# Altium footprint library Connectors.PcbLib: 245 footprints (part 9 of 16)
Each footprint in its own frame and in the unit in brackets; x right, y up, seen from the top. Pads: shape width x height; smd on the part's side, far side on the other; paste and mask are expansions set on the pad; w line width, h text height; cw(c..) or ccw(c..) is an arc to the next point about the centre after c.
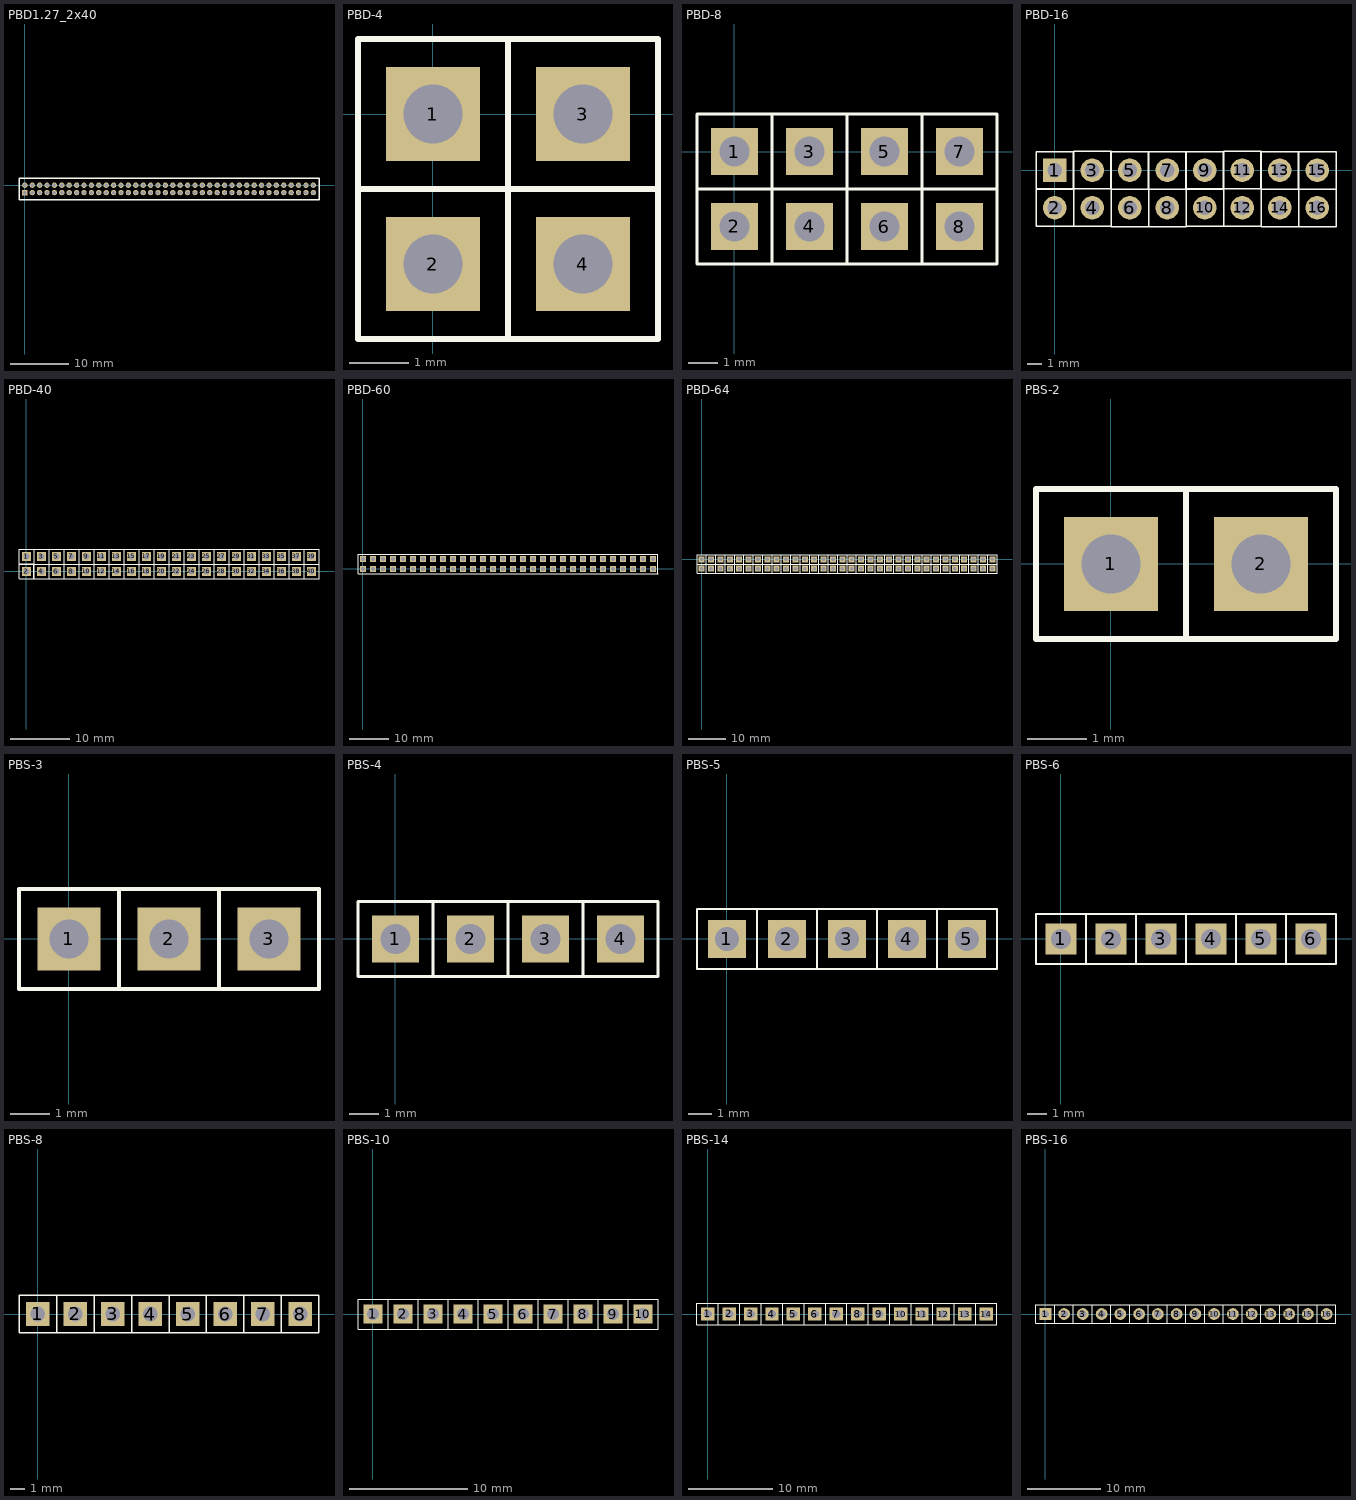
[diagram p8: the footprints below, top view; thin cyan lines are the x and y axes]

## PBD1.27_2х40 [mm]
pads (80):
  rect 0.91x0.91 hole 0.6: 1(0,-1.27)
  round 0.91 hole 0.6: 2(0,0) 3(1.27,-1.27) 4(1.27,0) 5(2.54,-1.27) 6(2.54,0) 7(3.81,-1.27) 8(3.81,0) 9(5.08,-1.27) 10(5.08,0) 11(6.35,-1.27) 12(6.35,0) 13(7.62,-1.27) 14(7.62,0) 15(8.89,-1.27) 16(8.89,0) 17(10.16,-1.27) 18(10.16,0) 19(11.43,-1.27) 20(11.43,0) 21(12.7,-1.27) 22(12.7,0) 23(13.97,-1.27) 24(13.97,0) 25(15.24,-1.27) 26(15.24,0) 27(16.51,-1.27) 28(16.51,0) 29(17.78,-1.27) 30(17.78,0) 31(19.05,-1.27) 32(19.05,0) 33(20.32,-1.27) 34(20.32,0) 35(21.59,-1.27) 36(21.59,0) 37(22.86,-1.27) 38(22.86,0) 39(24.13,-1.27) 40(24.13,0) 41(25.4,-1.27) 42(25.4,0) 43(26.67,-1.27) 44(26.67,0) 45(27.94,-1.27) 46(27.94,0) 47(29.21,-1.27) 48(29.21,0) 49(30.48,-1.27) 50(30.48,0) 51(31.75,-1.27) 52(31.75,0) 53(33.02,-1.27) 54(33.02,0) 55(34.29,-1.27) 56(34.29,0) 57(35.56,-1.27) 58(35.56,0) 59(36.83,-1.27) 60(36.83,0) 61(38.1,-1.27) 62(38.1,0) 63(39.37,-1.27) 64(39.37,0) 65(40.64,-1.27) 66(40.64,0) 67(41.91,-1.27) 68(41.91,0) 69(43.18,-1.27) 70(43.18,0) 71(44.45,-1.27) 72(44.45,0) 73(45.72,-1.27) 74(45.72,0) 75(46.99,-1.27) 76(46.99,0) 77(48.26,-1.27) 78(48.26,0) 79(49.53,-1.27) 80(49.53,0)
Top Overlay:
  lines w0.254: -1,-2.5 -1,1.2 50.5,1.2 50.5,-2.5 -1,-2.5

## PBD-4 [mm]
pads (4):
  rect 1.6x1.6 hole 1: 1(0.001,0) 2(0.001,-2.54) 3(2.541,0) 4(2.541,-2.54)
Top Overlay:
  lines w0.1: -1.269,-1.27 -1.269,1.27 1.271,1.27 ; -1.269,-1.27 1.271,-1.27 ; -1.269,-1.27 1.271,-1.27 ; -1.269,-1.27 -1.269,-3.81 1.271,-3.81 ; 1.271,-3.81 3.811,-3.81 ; 1.271,-3.81 1.271,-1.27 ; 1.271,-3.81 1.271,-1.27 ; 1.271,-1.27 1.271,1.27 ; 1.271,-1.27 3.811,-1.27 ; 1.271,-1.27 1.271,1.27 ; 1.271,-1.27 3.811,-1.27 ; 1.271,1.27 3.811,1.27 ; 3.811,-3.81 3.811,-1.27 ; 3.811,-3.81 3.811,-1.27 ; 3.811,-1.27 3.811,1.27 ; 3.811,-1.27 3.811,1.27
3D body "User Library-PBS-01.step": height 8.4, standoff -3.2, extent 1.271,-3.81 3.811,-1.27
3D body "User Library-PBS-01.step": height 8.4, standoff -3.2, extent -1.269,-3.81 1.271,-1.27
3D body "User Library-PBS-01.step": height 8.4, standoff -3.2, extent 1.271,-1.27 3.811,1.27
3D body "User Library-PBS-01.step": height 8.4, standoff -3.2, extent -1.269,-1.27 1.271,1.27

## PBD-8 [mm]
pads (8):
  rect 1.6x1.6 hole 1: 1(0,0) 2(0,-2.54) 3(2.54,0) 4(2.54,-2.54) 5(5.08,0) 6(5.08,-2.54) 7(7.62,0) 8(7.62,-2.54)
Top Overlay:
  lines w0.1: -1.27,-1.27 -1.27,1.27 1.27,1.27 ; -1.27,-1.27 1.27,-1.27 ; -1.27,-1.27 1.27,-1.27 ; -1.27,-1.27 -1.27,-3.81 1.27,-3.81 ; 1.27,-3.81 3.81,-3.81 ; 1.27,-3.81 1.27,-1.27 ; 1.27,-3.81 1.27,-1.27 ; 1.27,-1.27 1.27,1.27 ; 1.27,-1.27 3.81,-1.27 ; 1.27,-1.27 1.27,1.27 ; 1.27,-1.27 3.81,-1.27 ; 1.27,1.27 3.81,1.27 ; 3.81,-3.81 3.81,-1.27 ; 3.81,-3.81 6.35,-3.81 ; 3.81,-3.81 3.81,-1.27 ; 3.81,-3.81 3.81,-1.27 ; 3.81,-1.27 6.35,-1.27 ; 3.81,-1.27 6.35,-1.27 ; 3.81,-1.27 3.81,1.27 ; 3.81,-1.27 3.81,1.27 ; 3.81,-1.27 3.81,1.27 ; 3.81,1.27 6.35,1.27 ; 6.35,-3.81 6.35,-1.27 ; 6.35,-3.81 6.35,-1.27 ; 6.35,-3.81 8.89,-3.81 ; 6.35,-1.27 8.89,-1.27 ; 6.35,-1.27 6.35,1.27 ; 6.35,-1.27 8.89,-1.27 ; 6.35,-1.27 6.35,1.27 ; 6.35,1.27 8.89,1.27 ; 8.89,-3.81 8.89,-1.27 ; 8.89,-3.81 8.89,-1.27 ; 8.89,-1.27 8.89,1.27 ; 8.89,-1.27 8.89,1.27
3D body "User Library-PBS-01.step": height 8.4, standoff -3.2, extent 3.81,-1.27 6.35,1.27
3D body "User Library-PBS-01.step": height 8.4, standoff -3.2, extent 6.35,-1.27 8.89,1.27
3D body "User Library-PBS-01.step": height 8.4, standoff -3.2, extent 3.81,-3.81 6.35,-1.27
3D body "User Library-PBS-01.step": height 8.4, standoff -3.2, extent 6.35,-3.81 8.89,-1.27
3D body "User Library-PBS-01.step": height 8.4, standoff -3.2, extent 1.27,-3.81 3.81,-1.27
3D body "User Library-PBS-01.step": height 8.4, standoff -3.2, extent -1.27,-3.81 1.27,-1.27
3D body "User Library-PBS-01.step": height 8.4, standoff -3.2, extent 1.27,-1.27 3.81,1.27
3D body "User Library-PBS-01.step": height 8.4, standoff -3.2, extent -1.27,-1.27 1.27,1.27

## PBD-16 [mm]
pads (16):
  rect 1.6x1.6 hole 1: 1(0,0)
  round 1.6 hole 1: 2(0,-2.54) 3(2.54,0) 4(2.54,-2.54) 5(5.08,0) 6(5.08,-2.54) 7(7.62,0) 8(7.62,-2.54) 9(10.16,0) 10(10.16,-2.54) 11(12.7,0) 12(12.7,-2.54) 13(15.24,0) 14(15.24,-2.54) 15(17.78,0) 16(17.78,-2.54)
Top Overlay:
  lines w0.1: -1.27,-1.27 -1.27,-3.81 1.27,-3.81 ; -1.27,-1.27 1.27,-1.27 ; -1.27,-1.27 1.27,-1.27 ; -1.27,-1.27 -1.27,1.27 1.27,1.27 ; 1.27,-3.81 1.27,-1.27 ; 1.27,-3.81 1.27,-1.27 ; 1.27,-3.81 3.81,-3.81 ; 1.27,-1.27 3.81,-1.27 ; 1.27,-1.27 1.27,1.27 ; 1.27,-1.27 3.81,-1.27 ; 1.27,-1.27 1.27,1.27 ; 1.27,1.27 3.81,1.27 ; 3.81,-3.81 3.81,-1.27 ; 3.81,-3.81 3.81,-1.27 ; 3.81,-3.81 6.35,-3.81 ; 3.81,-3.81 3.81,-1.27 ; 3.81,-1.27 3.81,1.27 ; 3.81,-1.27 3.81,1.27 ; 3.81,-1.27 3.81,1.27 ; 3.81,-1.27 6.35,-1.27 ; 3.81,-1.27 6.35,-1.27 ; 3.81,1.27 6.35,1.27 ; 6.35,-3.81 8.89,-3.81 ; 6.35,-3.81 6.35,-1.27 ; 6.35,-3.81 6.35,-1.27 ; 6.35,-1.27 6.35,1.27 ; 6.35,-1.27 8.89,-1.27 ; 6.35,-1.27 6.35,1.27 ; 6.35,-1.27 8.89,-1.27 ; 6.35,1.27 8.89,1.27 ; 8.89,-3.81 8.89,-1.27 ; 8.89,-3.81 8.89,-1.27 ; 8.89,-3.81 11.43,-3.81 ; 8.89,-3.81 8.89,-1.27 ; 8.89,-1.27 8.89,1.27 ; 8.89,-1.27 8.89,1.27 ; 8.89,-1.27 8.89,1.27 ; 8.89,-1.27 11.43,-1.27 ; 8.89,-1.27 11.43,-1.27 ; 8.89,1.27 11.43,1.27 ; 11.43,-3.81 13.97,-3.81 ; 11.43,-3.81 11.43,-1.27 ; 11.43,-3.81 11.43,-1.27 ; 11.43,-1.27 11.43,1.27 ; 11.43,-1.27 13.97,-1.27 ; 11.43,-1.27 11.43,1.27 ; 11.43,-1.27 13.97,-1.27 ; 11.43,1.27 13.97,1.27 ; 13.97,-3.81 13.97,-1.27 ; 13.97,-3.81 16.51,-3.81 ; 13.97,-3.81 13.97,-1.27 ; 13.97,-3.81 13.97,-1.27 ; 13.97,-1.27 16.51,-1.27 ; 13.97,-1.27 16.51,-1.27 ; 13.97,-1.27 13.97,1.27 ; 13.97,-1.27 13.97,1.27 ; 13.97,-1.27 13.97,1.27 ; 13.97,1.27 16.51,1.27 ; 16.51,-3.81 16.51,-1.27 ; 16.51,-3.81 16.51,-1.27 ; 16.51,-3.81 19.05,-3.81 ; 16.51,-1.27 19.05,-1.27 ; 16.51,-1.27 16.51,1.27 ; 16.51,-1.27 19.05,-1.27 ; 16.51,-1.27 16.51,1.27 ; 16.51,1.27 19.05,1.27 ; 19.05,-3.81 19.05,-1.27 ; 19.05,-3.81 19.05,-1.27 ; 19.05,-1.27 19.05,1.27 ; 19.05,-1.27 19.05,1.27
3D body "User Library-PBS-01.step": height 8.4, standoff -3.2, extent -1.27,-1.27 1.27,1.27
3D body "User Library-PBS-01.step": height 8.4, standoff -3.2, extent 1.27,-1.27 3.81,1.27
3D body "User Library-PBS-01.step": height 8.4, standoff -3.2, extent -1.27,-3.81 1.27,-1.27
3D body "User Library-PBS-01.step": height 8.4, standoff -3.2, extent 1.27,-3.81 3.81,-1.27
3D body "User Library-PBS-01.step": height 8.4, standoff -3.2, extent 6.35,-3.81 8.89,-1.27
3D body "User Library-PBS-01.step": height 8.4, standoff -3.2, extent 3.81,-3.81 6.35,-1.27
3D body "User Library-PBS-01.step": height 8.4, standoff -3.2, extent 6.35,-1.27 8.89,1.27
3D body "User Library-PBS-01.step": height 8.4, standoff -3.2, extent 3.81,-1.27 6.35,1.27
3D body "User Library-PBS-01.step": height 8.4, standoff -3.2, extent 13.97,-1.27 16.51,1.27
3D body "User Library-PBS-01.step": height 8.4, standoff -3.2, extent 16.51,-1.27 19.05,1.27
3D body "User Library-PBS-01.step": height 8.4, standoff -3.2, extent 13.97,-3.81 16.51,-1.27
3D body "User Library-PBS-01.step": height 8.4, standoff -3.2, extent 16.51,-3.81 19.05,-1.27
3D body "User Library-PBS-01.step": height 8.4, standoff -3.2, extent 11.43,-3.81 13.97,-1.27
3D body "User Library-PBS-01.step": height 8.4, standoff -3.2, extent 8.89,-3.81 11.43,-1.27
3D body "User Library-PBS-01.step": height 8.4, standoff -3.2, extent 11.43,-1.27 13.97,1.27
3D body "User Library-PBS-01.step": height 8.4, standoff -3.2, extent 8.89,-1.27 11.43,1.27

## PBD-40 [mm]
pads (40):
  rect 1.6x1.6 hole 1: 1(0,2.54) 2(0,0) 3(2.54,2.54) 4(2.54,0) 5(5.08,2.54) 6(5.08,0) 7(7.62,2.54) 8(7.62,0) 9(10.16,2.54) 10(10.16,0) 11(12.7,2.54) 12(12.7,0) 13(15.24,2.54) 14(15.24,0) 15(17.78,2.54) 16(17.78,0) 17(20.32,2.54) 18(20.32,0) 19(22.86,2.54) 20(22.86,0) 21(25.4,2.54) 22(25.4,0) 23(27.94,2.54) 24(27.94,0) 25(30.48,2.54) 26(30.48,0) 27(33.02,2.54) 28(33.02,0) 29(35.56,2.54) 30(35.56,0) 31(38.1,2.54) 32(38.1,0) 33(40.64,2.54) 34(40.64,0) 35(43.18,2.54) 36(43.18,0) 37(45.72,2.54) 38(45.72,0) 39(48.26,2.54) 40(48.26,0)
Top Overlay:
  drawing of 162 lines, arcs and shapes, not listed
3D body "User Library-PBD2_54-20.step": height 8.4, standoff -2.7, extent 24.07,-1.27 49.47,3.81
3D body "User Library-PBD2_54-20.step": height 8.4, standoff -2.7, extent -1.33,-1.27 24.07,3.81

## PBD-60 [mm]
pads (60):
  rect 1.6x1.6 hole 1: 1(0,2.54) 2(0,0) 3(2.54,2.54) 4(2.54,0) 5(5.08,2.54) 6(5.08,0) 7(7.62,2.54) 8(7.62,0) 9(10.16,2.54) 10(10.16,0) 11(12.7,2.54) 12(12.7,0) 13(15.24,2.54) 14(15.24,0) 15(17.78,2.54) 16(17.78,0) 17(20.32,2.54) 18(20.32,0) 19(22.86,2.54) 20(22.86,0) 21(25.4,2.54) 22(25.4,0) 23(27.94,2.54) 24(27.94,0) 25(30.48,2.54) 26(30.48,0) 27(33.02,2.54) 28(33.02,0) 29(35.56,2.54) 30(35.56,0) 31(38.1,2.54) 32(38.1,0) 33(40.64,2.54) 34(40.64,0) 35(43.18,2.54) 36(43.18,0) 37(45.72,2.54) 38(45.72,0) 39(48.26,2.54) 40(48.26,0) 41(50.8,2.54) 42(50.8,0) 43(53.34,2.54) 44(53.34,0) 45(55.88,2.54) 46(55.88,0) 47(58.42,2.54) 48(58.42,0) 49(60.96,2.54) 50(60.96,0) 51(63.5,2.54) 52(63.5,0) 53(66.04,2.54) 54(66.04,0) 55(68.58,2.54) 56(68.58,0) 57(71.12,2.54) 58(71.12,0) 59(73.66,2.54) 60(73.66,0)
Top Overlay:
  lines w0.1: -1.27,-1.27 -1.27,1.27 -1.27,3.81 ; -1.25,-1.24 1.29,-1.24 ; -1.25,-1.24 1.29,-1.24 ; -1.27,3.81 1.27,3.81 ; -1.27,3.81 1.27,3.81 ; 1.27,3.81 3.81,3.81 ; 1.27,3.81 3.81,3.81 ; 1.29,-1.24 3.83,-1.24 ; 1.29,-1.24 3.83,-1.24 ; 3.81,3.81 6.35,3.81 ; 3.81,3.81 6.35,3.81 ; 3.83,-1.24 6.37,-1.24 ; 3.83,-1.24 6.37,-1.24 ; 6.35,3.81 8.89,3.81 ; 6.35,3.81 8.89,3.81 ; 6.37,-1.24 8.91,-1.24 ; 6.37,-1.24 8.91,-1.24 ; 8.89,3.81 11.43,3.81 ; 8.89,3.81 11.43,3.81 ; 8.91,-1.24 11.45,-1.24 ; 8.91,-1.24 11.45,-1.24 ; 11.43,3.81 13.97,3.81 ; 11.43,3.81 13.97,3.81 ; 11.45,-1.24 13.99,-1.24 ; 11.45,-1.24 13.99,-1.24 ; 13.97,3.81 16.51,3.81 ; 13.97,3.81 16.51,3.81 ; 13.99,-1.24 16.53,-1.24 ; 13.99,-1.24 16.53,-1.24 ; 16.51,3.81 19.05,3.81 ; 16.51,3.81 19.05,3.81 ; 16.53,-1.24 19.07,-1.24 ; 16.53,-1.24 19.07,-1.24 ; 19.05,3.81 21.59,3.81 ; 19.05,3.81 21.59,3.81 ; 19.07,-1.24 21.61,-1.24 ; 19.07,-1.24 21.61,-1.24 ; 21.59,3.81 24.13,3.81 ; 21.59,3.81 24.13,3.81 ; 21.61,-1.24 24.15,-1.24 ; 21.61,-1.24 24.15,-1.24 ; 24.13,3.81 26.67,3.81 ; 24.13,3.81 26.67,3.81 ; 24.15,-1.24 26.69,-1.24 ; 24.15,-1.24 26.69,-1.24 ; 26.67,3.81 29.21,3.81 ; 26.67,3.81 29.21,3.81 ; 26.69,-1.24 29.23,-1.24 ; 26.69,-1.24 29.23,-1.24 ; 29.21,3.81 31.75,3.81 ; 29.21,3.81 31.75,3.81 ; 29.23,-1.24 31.77,-1.24 ; 29.23,-1.24 31.77,-1.24 ; 31.75,3.81 34.29,3.81 ; 31.75,3.81 34.29,3.81 ; 31.77,-1.24 34.31,-1.24 ; 31.77,-1.24 34.31,-1.24 ; 34.29,3.81 36.83,3.81 ; 34.29,3.81 36.83,3.81 ; 34.31,-1.24 36.85,-1.24 ; 34.31,-1.24 36.85,-1.24 ; 36.83,3.81 39.37,3.81 ; 36.83,3.81 39.37,3.81 ; 36.85,-1.24 39.39,-1.24 ; 36.85,-1.24 39.39,-1.24 ; 39.37,3.81 41.91,3.81 ; 39.37,3.81 41.91,3.81 ; 39.39,-1.24 41.93,-1.24 ; 39.39,-1.24 41.93,-1.24 ; 41.91,3.81 44.45,3.81 ; 41.91,3.81 44.45,3.81 ; 41.93,-1.24 44.47,-1.24 ; 41.93,-1.24 44.47,-1.24 ; 44.45,3.81 46.99,3.81 ; 44.45,3.81 46.99,3.81 ; 44.47,-1.24 47.01,-1.24 ; 44.47,-1.24 47.01,-1.24 ; 46.99,3.81 49.53,3.81 ; 46.99,3.81 49.53,3.81 ; 47.01,-1.24 49.55,-1.24 ; 47.01,-1.24 49.55,-1.24 ; 49.53,3.81 52.07,3.81 ; 49.53,3.81 52.07,3.81 ; 49.55,-1.24 52.09,-1.24 ; 49.55,-1.24 52.09,-1.24 ; 52.07,3.81 54.61,3.81 ; 52.07,3.81 54.61,3.81 ; 52.09,-1.24 54.63,-1.24 ; 52.09,-1.24 54.63,-1.24 ; 54.61,3.81 57.15,3.81 ; 54.61,3.81 57.15,3.81 ; 54.63,-1.24 57.17,-1.24 ; 54.63,-1.24 57.17,-1.24 ; 57.15,3.81 59.69,3.81 ; 57.15,3.81 59.69,3.81 ; 57.17,-1.24 59.71,-1.24 ; 57.17,-1.24 59.71,-1.24 ; 59.69,3.81 62.23,3.81 ; 59.69,3.81 62.23,3.81 ; 59.71,-1.24 62.25,-1.24 ; 59.71,-1.24 62.25,-1.24 ; 62.23,3.81 64.77,3.81 ; 62.23,3.81 64.77,3.81 ; 62.25,-1.24 64.79,-1.24 ; 62.25,-1.24 64.79,-1.24 ; 64.77,3.81 67.31,3.81 ; 64.77,3.81 67.31,3.81 ; 64.79,-1.24 67.33,-1.24 ; 64.79,-1.24 67.33,-1.24 ; 67.31,3.81 69.85,3.81 ; 67.31,3.81 69.85,3.81 ; 67.33,-1.24 69.87,-1.24 ; 67.33,-1.24 69.87,-1.24 ; 69.85,3.81 72.39,3.81 ; 69.85,3.81 72.39,3.81 ; 69.87,-1.24 72.41,-1.24 ; 69.87,-1.24 72.41,-1.24 ; 72.39,3.81 74.93,3.81 ; 72.39,3.81 74.93,3.81 ; 72.41,-1.24 74.95,-1.24 72.41,-1.24 ; 74.93,1.27 74.93,3.81 ; 74.93,1.27 74.93,-1.27 74.93,1.27 ; 74.93,1.27 74.93,3.81
3D body "User Library-PBD2_54-20.step": height 8.4, standoff -2.7, extent -1.25,-1.24 24.15,3.84
3D body "User Library-PBD2_54-20.step": height 8.4, standoff -2.7, extent 24.15,-1.24 49.55,3.84
3D body "User Library-PBD2_54-20.step": height 8.4, standoff -2.7, extent 49.55,-1.24 74.95,3.84

## PBD-64 [mm]
pads (64):
  rect 1.6x1.6 hole 1: 1(0,0) 2(0,-2.54) 3(2.54,0) 4(2.54,-2.54) 5(5.08,0) 6(5.08,-2.54) 7(7.62,0) 8(7.62,-2.54) 9(10.16,0) 10(10.16,-2.54) 11(12.7,0) 12(12.7,-2.54) 13(15.24,0) 14(15.24,-2.54) 15(17.78,0) 16(17.78,-2.54) 17(20.32,0) 18(20.32,-2.54) 19(22.86,0) 20(22.86,-2.54) 21(25.4,0) 22(25.4,-2.54) 23(27.94,0) 24(27.94,-2.54) 25(30.48,0) 26(30.48,-2.54) 27(33.02,0) 28(33.02,-2.54) 29(35.56,0) 30(35.56,-2.54) 31(38.1,0) 32(38.1,-2.54) 33(40.64,0) 34(40.64,-2.54) 35(43.18,0) 36(43.18,-2.54) 37(45.72,0) 38(45.72,-2.54) 39(48.26,0) 40(48.26,-2.54) 41(50.8,0) 42(50.8,-2.54) 43(53.34,0) 44(53.34,-2.54) 45(55.88,0) 46(55.88,-2.54) 47(58.42,0) 48(58.42,-2.54) 49(60.96,0) 50(60.96,-2.54) 51(63.5,0) 52(63.5,-2.54) 53(66.04,0) 54(66.04,-2.54) 55(68.58,0) 56(68.58,-2.54) 57(71.12,0) 58(71.12,-2.54) 59(73.66,0) 60(73.66,-2.54) 61(76.2,0) 62(76.2,-2.54) 63(78.74,0) 64(78.74,-2.54)
Top Overlay:
  drawing of 256 lines, arcs and shapes, not listed
3D body "User Library-PBD2_54-20.step": height 8.4, standoff -2.7, extent -1.27,-3.81 24.13,1.27
3D body "User Library-PBD2_54-20.step": height 8.4, standoff -2.7, extent 24.13,-3.81 49.53,1.27
3D body "User Library-PBD2_54-20.step": height 8.4, standoff -2.7, extent 54.61,-3.81 80.01,1.27
3D body "User Library-PBD2_54-20.step": height 8.4, standoff -2.7, extent 49.53,-3.81 74.93,1.27

## PBS-2 [mm]
pads (2):
  rect 1.6x1.6 hole 1: 1(0,0) 2(2.54,0)
Top Overlay:
  lines w0.1: 1.27,-1.27 1.27,1.27 ; 1.27,-1.27 1.27,1.27 ; 1.27,-1.27 -1.27,-1.27 -1.27,1.27 1.27,1.27 ; 1.27,-1.27 3.81,-1.27 ; 1.27,1.27 3.81,1.27 ; 3.81,-1.27 3.81,1.27 ; 3.81,-1.27 3.81,1.27
3D body "User Library-PBS-01.step": height 8.4, standoff -3.2, extent 1.27,-1.27 3.81,1.27
3D body "User Library-PBS-01.step": height 8.4, standoff -3.2, extent -1.27,-1.27 1.27,1.27

## PBS-3 [mm]
pads (3):
  rect 1.6x1.6 hole 1: 1(0,0) 2(2.54,0) 3(5.08,0)
Top Overlay:
  lines w0.1: 1.27,-1.27 1.27,1.27 ; 1.27,-1.27 1.27,1.27 ; 1.27,-1.27 -1.27,-1.27 -1.27,1.27 1.27,1.27 ; 1.27,-1.27 3.81,-1.27 ; 1.27,1.27 3.81,1.27 ; 3.81,-1.27 3.81,1.27 ; 3.81,-1.27 3.81,1.27 ; 3.81,-1.27 6.35,-1.27 ; 3.81,1.27 6.35,1.27 ; 6.35,-1.27 6.35,1.27 ; 6.35,-1.27 6.35,1.27 ; 6.35,-1.27 6.35,1.27
3D body "User Library-PBS-01.step": height 8.4, standoff -3.2, extent 3.81,-1.27 6.35,1.27
3D body "User Library-PBS-01.step": height 8.4, standoff -3.2, extent 1.27,-1.27 3.81,1.27
3D body "User Library-PBS-01.step": height 8.4, standoff -3.2, extent -1.27,-1.27 1.27,1.27

## PBS-4 [mm]
pads (4):
  rect 1.6x1.6 hole 1: 1(0,0) 2(2.54,0) 3(5.08,0) 4(7.62,0)
Top Overlay:
  lines w0.1: 1.27,-1.27 1.27,1.27 ; 1.27,-1.27 1.27,1.27 ; 1.27,-1.27 -1.27,-1.27 -1.27,1.27 1.27,1.27 ; 1.27,-1.27 3.81,-1.27 ; 1.27,1.27 3.81,1.27 ; 3.81,-1.27 3.81,1.27 ; 3.81,-1.27 3.81,1.27 ; 3.81,-1.27 6.35,-1.27 ; 3.81,1.27 6.35,1.27 ; 6.35,-1.27 8.89,-1.27 ; 6.35,-1.27 6.35,1.27 ; 6.35,-1.27 6.35,1.27 ; 6.35,-1.27 6.35,1.27 ; 6.35,-1.27 6.35,1.27 ; 6.35,-1.27 6.35,1.27 ; 6.35,1.27 8.89,1.27 ; 8.89,-1.27 8.89,1.27 ; 8.89,-1.27 8.89,1.27 ; 8.89,-1.27 8.89,1.27
3D body "User Library-PBS-01.step": height 8.4, standoff -3.2, extent 6.35,-1.27 8.89,1.27
3D body "User Library-PBS-01.step": height 8.4, standoff -3.2, extent 3.81,-1.27 6.35,1.27
3D body "User Library-PBS-01.step": height 8.4, standoff -3.2, extent 1.27,-1.27 3.81,1.27
3D body "User Library-PBS-01.step": height 8.4, standoff -3.2, extent -1.27,-1.27 1.27,1.27

## PBS-5 [mm]
pads (5):
  rect 1.6x1.6 hole 1: 1(0,0) 2(2.54,0) 3(5.08,0) 4(7.62,0) 5(10.16,0)
Top Overlay:
  lines w0.1: 1.27,-1.27 1.27,1.27 ; 1.27,-1.27 1.27,1.27 ; 1.27,-1.27 -1.27,-1.27 -1.27,1.27 1.27,1.27 ; 1.27,-1.27 3.81,-1.27 ; 1.27,1.27 3.81,1.27 ; 3.81,-1.27 3.81,1.27 ; 3.81,-1.27 3.81,1.27 ; 3.81,-1.27 6.35,-1.27 ; 3.81,1.27 6.35,1.27 ; 6.35,-1.27 6.35,1.27 ; 6.35,-1.27 6.35,1.27 ; 6.35,-1.27 6.35,1.27 ; 6.35,-1.27 8.89,-1.27 ; 6.35,-1.27 6.35,1.27 ; 6.35,-1.27 6.35,1.27 ; 6.35,1.27 8.89,1.27 ; 8.89,-1.27 11.43,-1.27 ; 8.89,-1.27 8.89,1.27 ; 8.89,-1.27 8.89,1.27 ; 8.89,1.27 11.43,1.27 ; 11.43,-1.27 11.43,1.27 ; 11.43,-1.27 11.43,1.27 ; 11.43,-1.27 11.43,1.27
3D body "User Library-PBS-01.step": height 8.4, standoff -3.2, extent 3.81,-1.27 6.35,1.27
3D body "User Library-PBS-01.step": height 8.4, standoff -3.2, extent 1.27,-1.27 3.81,1.27
3D body "User Library-PBS-01.step": height 8.4, standoff -3.2, extent -1.27,-1.27 1.27,1.27
3D body "User Library-PBS-01.step": height 8.4, standoff -3.2, extent 6.35,-1.27 8.89,1.27
3D body "User Library-PBS-01.step": height 8.4, standoff -3.2, extent 8.89,-1.27 11.43,1.27

## PBS-6 [mm]
pads (6):
  rect 1.6x1.6 hole 1: 1(0,0) 2(2.54,0) 3(5.08,0) 4(7.62,0) 5(10.16,0) 6(12.7,0)
Top Overlay:
  lines w0.1: 1.27,-1.27 1.27,1.27 ; 1.27,-1.27 1.27,1.27 ; 1.27,-1.27 -1.27,-1.27 -1.27,1.27 1.27,1.27 ; 1.27,-1.27 3.81,-1.27 ; 1.27,1.27 3.81,1.27 ; 3.81,-1.27 3.81,1.27 ; 3.81,-1.27 3.81,1.27 ; 3.81,-1.27 6.35,-1.27 ; 3.81,1.27 6.35,1.27 ; 6.35,-1.27 6.35,1.27 ; 6.35,-1.27 6.35,1.27 ; 6.35,-1.27 6.35,1.27 ; 6.35,-1.27 8.89,-1.27 ; 6.35,-1.27 6.35,1.27 ; 6.35,-1.27 6.35,1.27 ; 6.35,1.27 8.89,1.27 ; 8.89,-1.27 11.43,-1.27 ; 8.89,-1.27 8.89,1.27 ; 8.89,-1.27 8.89,1.27 ; 8.89,1.27 11.43,1.27 ; 11.43,-1.27 11.43,1.27 ; 11.43,-1.27 11.43,1.27 ; 11.43,-1.27 11.43,1.27 ; 11.43,-1.27 13.97,-1.27 13.97,1.27 11.43,1.27
3D body "User Library-PBS-01.step": height 8.4, standoff -3.2, extent 3.81,-1.27 6.35,1.27
3D body "User Library-PBS-01.step": height 8.4, standoff -3.2, extent 1.27,-1.27 3.81,1.27
3D body "User Library-PBS-01.step": height 8.4, standoff -3.2, extent -1.27,-1.27 1.27,1.27
3D body "User Library-PBS-01.step": height 8.4, standoff -3.2, extent 6.35,-1.27 8.89,1.27
3D body "User Library-PBS-01.step": height 8.4, standoff -3.2, extent 8.89,-1.27 11.43,1.27
3D body "User Library-PBS-01.step": height 8.4, standoff -3.2, extent 11.43,-1.27 13.97,1.27

## PBS-8 [mm]
pads (8):
  rect 1.6x1.6 hole 1: 1(0,0) 2(2.54,0) 3(5.08,0) 4(7.62,0) 5(10.16,0) 6(12.7,0) 7(15.24,0) 8(17.78,0)
Top Overlay:
  lines w0.1: 1.27,-1.27 1.27,1.27 ; 1.27,-1.27 1.27,1.27 ; 1.27,-1.27 -1.27,-1.27 -1.27,1.27 1.27,1.27 ; 1.27,-1.27 3.81,-1.27 ; 1.27,1.27 3.81,1.27 ; 3.81,-1.27 3.81,1.27 ; 3.81,-1.27 3.81,1.27 ; 3.81,-1.27 6.35,-1.27 ; 3.81,1.27 6.35,1.27 ; 6.35,-1.27 8.89,-1.27 ; 6.35,-1.27 6.35,1.27 ; 6.35,-1.27 6.35,1.27 ; 6.35,-1.27 6.35,1.27 ; 6.35,1.27 8.89,1.27 ; 8.89,-1.27 11.43,-1.27 ; 8.89,-1.27 8.89,1.27 ; 8.89,-1.27 8.89,1.27 ; 8.89,1.27 11.43,1.27 ; 11.43,-1.27 13.97,-1.27 ; 11.43,-1.27 11.43,1.27 ; 11.43,-1.27 11.43,1.27 ; 11.43,1.27 13.97,1.27 ; 13.97,-1.27 16.51,-1.27 ; 13.97,-1.27 13.97,1.27 ; 13.97,-1.27 13.97,1.27 ; 13.97,1.27 16.51,1.27 ; 16.51,-1.27 19.05,-1.27 ; 16.51,-1.27 16.51,1.27 ; 16.51,-1.27 16.51,1.27 ; 16.51,1.27 19.05,1.27 ; 19.05,-1.27 19.05,1.27 ; 19.05,-1.27 19.05,1.27
3D body "User Library-PBS-01.step": height 8.4, standoff -3.2, extent 16.51,-1.27 19.05,1.27
3D body "User Library-PBS-01.step": height 8.4, standoff -3.2, extent 13.97,-1.27 16.51,1.27
3D body "User Library-PBS-01.step": height 8.4, standoff -3.2, extent 11.43,-1.27 13.97,1.27
3D body "User Library-PBS-01.step": height 8.4, standoff -3.2, extent 8.89,-1.27 11.43,1.27
3D body "User Library-PBS-01.step": height 8.4, standoff -3.2, extent 6.35,-1.27 8.89,1.27
3D body "User Library-PBS-01.step": height 8.4, standoff -3.2, extent 3.81,-1.27 6.35,1.27
3D body "User Library-PBS-01.step": height 8.4, standoff -3.2, extent 1.27,-1.27 3.81,1.27
3D body "User Library-PBS-01.step": height 8.4, standoff -3.2, extent -1.27,-1.27 1.27,1.27

## PBS-10 [mm]
pads (10):
  rect 1.6x1.6 hole 1: 1(0,0) 2(2.54,0) 3(5.08,0) 4(7.62,0) 5(10.16,0) 6(12.7,0) 7(15.24,0) 8(17.78,0) 9(20.32,0) 10(22.86,0)
Top Overlay:
  lines w0.1: 1.27,-1.27 1.27,1.27 ; 1.27,-1.27 1.27,1.27 ; 1.27,-1.27 -1.27,-1.27 -1.27,1.27 1.27,1.27 ; 1.27,-1.27 3.81,-1.27 ; 1.27,1.27 3.81,1.27 ; 3.81,-1.27 3.81,1.27 ; 3.81,-1.27 3.81,1.27 ; 3.81,-1.27 6.35,-1.27 ; 3.81,1.27 6.35,1.27 ; 6.35,-1.27 8.89,-1.27 ; 6.35,-1.27 6.35,1.27 ; 6.35,-1.27 6.35,1.27 ; 6.35,-1.27 6.35,1.27 ; 6.35,1.27 8.89,1.27 ; 8.89,-1.27 11.43,-1.27 ; 8.89,-1.27 8.89,1.27 ; 8.89,-1.27 8.89,1.27 ; 8.89,1.27 11.43,1.27 ; 11.43,-1.27 13.97,-1.27 ; 11.43,-1.27 11.43,1.27 ; 11.43,-1.27 11.43,1.27 ; 11.43,1.27 13.97,1.27 ; 13.97,-1.27 16.51,-1.27 ; 13.97,-1.27 13.97,1.27 ; 13.97,-1.27 13.97,1.27 ; 13.97,1.27 16.51,1.27 ; 16.51,-1.27 19.05,-1.27 ; 16.51,-1.27 16.51,1.27 ; 16.51,-1.27 16.51,1.27 ; 16.51,1.27 19.05,1.27 ; 19.05,-1.27 21.59,-1.27 ; 19.05,-1.27 19.05,1.27 ; 19.05,-1.27 19.05,1.27 ; 19.05,1.27 21.59,1.27 ; 21.59,-1.27 24.13,-1.27 ; 21.59,-1.27 21.59,1.27 ; 21.59,-1.27 21.59,1.27 ; 21.59,1.27 24.13,1.27 ; 24.13,-1.27 24.13,1.27 ; 24.13,-1.27 24.13,1.27
3D body "User Library-PBS-01.step": height 8.4, standoff -3.2, extent 21.59,-1.27 24.13,1.27
3D body "User Library-PBS-01.step": height 8.4, standoff -3.2, extent 19.05,-1.27 21.59,1.27
3D body "User Library-PBS-01.step": height 8.4, standoff -3.2, extent 16.51,-1.27 19.05,1.27
3D body "User Library-PBS-01.step": height 8.4, standoff -3.2, extent 13.97,-1.27 16.51,1.27
3D body "User Library-PBS-01.step": height 8.4, standoff -3.2, extent 11.43,-1.27 13.97,1.27
3D body "User Library-PBS-01.step": height 8.4, standoff -3.2, extent 8.89,-1.27 11.43,1.27
3D body "User Library-PBS-01.step": height 8.4, standoff -3.2, extent 6.35,-1.27 8.89,1.27
3D body "User Library-PBS-01.step": height 8.4, standoff -3.2, extent 3.81,-1.27 6.35,1.27
3D body "User Library-PBS-01.step": height 8.4, standoff -3.2, extent 1.27,-1.27 3.81,1.27
3D body "User Library-PBS-01.step": height 8.4, standoff -3.2, extent -1.27,-1.27 1.27,1.27

## PBS-14 [mm]
pads (14):
  rect 1.6x1.6 hole 1: 1(0,0) 2(2.54,0) 3(5.08,0) 4(7.62,0) 5(10.16,0) 6(12.7,0) 7(15.24,0) 8(17.78,0) 9(20.32,0) 10(22.86,0) 11(25.4,0) 12(27.94,0) 13(30.48,0) 14(33.02,0)
Top Overlay:
  lines w0.1: 1.27,-1.27 1.27,1.27 ; 1.27,-1.27 1.27,1.27 ; 1.27,-1.27 -1.27,-1.27 -1.27,1.27 1.27,1.27 ; 1.27,-1.27 3.81,-1.27 ; 1.27,1.27 3.81,1.27 ; 3.81,-1.27 3.81,1.27 ; 3.81,-1.27 3.81,1.27 ; 3.81,-1.27 6.35,-1.27 ; 3.81,1.27 6.35,1.27 ; 6.35,-1.27 8.89,-1.27 ; 6.35,-1.27 6.35,1.27 ; 6.35,-1.27 6.35,1.27 ; 6.35,-1.27 6.35,1.27 ; 6.35,1.27 8.89,1.27 ; 8.89,-1.27 11.43,-1.27 ; 8.89,-1.27 8.89,1.27 ; 8.89,-1.27 8.89,1.27 ; 8.89,1.27 11.43,1.27 ; 11.43,-1.27 13.97,-1.27 ; 11.43,-1.27 11.43,1.27 ; 11.43,-1.27 11.43,1.27 ; 11.43,1.27 13.97,1.27 ; 13.97,-1.27 16.51,-1.27 ; 13.97,-1.27 13.97,1.27 ; 13.97,-1.27 13.97,1.27 ; 13.97,1.27 16.51,1.27 ; 16.51,-1.27 19.05,-1.27 ; 16.51,-1.27 16.51,1.27 ; 16.51,-1.27 16.51,1.27 ; 16.51,1.27 19.05,1.27 ; 19.05,-1.27 21.59,-1.27 ; 19.05,-1.27 19.05,1.27 ; 19.05,-1.27 19.05,1.27 ; 19.05,1.27 21.59,1.27 ; 21.59,-1.27 24.13,-1.27 ; 21.59,-1.27 21.59,1.27 ; 21.59,-1.27 21.59,1.27 ; 21.59,1.27 24.13,1.27 ; 24.13,-1.27 26.67,-1.27 ; 24.13,-1.27 24.13,1.27 ; 24.13,-1.27 24.13,1.27 ; 24.13,1.27 26.67,1.27 ; 26.67,-1.27 29.21,-1.27 ; 26.67,-1.27 26.67,1.27 ; 26.67,-1.27 26.67,1.27 ; 26.67,1.27 29.21,1.27 ; 29.21,-1.27 31.75,-1.27 ; 29.21,-1.27 29.21,1.27 ; 29.21,-1.27 29.21,1.27 ; 29.21,1.27 31.75,1.27 ; 31.75,-1.27 34.29,-1.27 34.29,1.27 31.75,1.27 ; 31.75,-1.27 31.75,1.27 ; 31.75,-1.27 31.75,1.27
3D body "User Library-PBS-01.step": height 8.4, standoff -3.2, extent 31.75,-1.27 34.29,1.27
3D body "User Library-PBS-01.step": height 8.4, standoff -3.2, extent 29.21,-1.27 31.75,1.27
3D body "User Library-PBS-01.step": height 8.4, standoff -3.2, extent 26.67,-1.27 29.21,1.27
3D body "User Library-PBS-01.step": height 8.4, standoff -3.2, extent 24.13,-1.27 26.67,1.27
3D body "User Library-PBS-01.step": height 8.4, standoff -3.2, extent 21.59,-1.27 24.13,1.27
3D body "User Library-PBS-01.step": height 8.4, standoff -3.2, extent 19.05,-1.27 21.59,1.27
3D body "User Library-PBS-01.step": height 8.4, standoff -3.2, extent 16.51,-1.27 19.05,1.27
3D body "User Library-PBS-01.step": height 8.4, standoff -3.2, extent 13.97,-1.27 16.51,1.27
3D body "User Library-PBS-01.step": height 8.4, standoff -3.2, extent 11.43,-1.27 13.97,1.27
3D body "User Library-PBS-01.step": height 8.4, standoff -3.2, extent 8.89,-1.27 11.43,1.27
3D body "User Library-PBS-01.step": height 8.4, standoff -3.2, extent 6.35,-1.27 8.89,1.27
3D body "User Library-PBS-01.step": height 8.4, standoff -3.2, extent 3.81,-1.27 6.35,1.27
3D body "User Library-PBS-01.step": height 8.4, standoff -3.2, extent 1.27,-1.27 3.81,1.27
3D body "User Library-PBS-01.step": height 8.4, standoff -3.2, extent -1.27,-1.27 1.27,1.27

## PBS-16 [mm]
pads (16):
  rect 1.6x1.6 hole 1: 1(0,0)
  round 1.6 hole 1: 2(2.54,0) 3(5.08,0) 4(7.62,0) 5(10.16,0) 6(12.7,0) 7(15.24,0) 8(17.78,0) 9(20.32,0) 10(22.86,0) 11(25.4,0) 12(27.94,0) 13(30.48,0) 14(33.02,0) 15(35.56,0) 16(38.1,0)
Top Overlay:
  lines w0.1: 1.27,-1.27 3.81,-1.27 ; 1.27,-1.27 -1.27,-1.27 -1.27,1.27 1.27,1.27 ; 1.27,-1.27 1.27,1.27 ; 1.27,-1.27 1.27,1.27 ; 1.27,1.27 3.81,1.27 ; 3.81,-1.27 6.35,-1.27 ; 3.81,-1.27 3.81,1.27 ; 3.81,-1.27 3.81,1.27 ; 3.81,1.27 6.35,1.27 ; 6.35,-1.27 6.35,1.27 ; 6.35,-1.27 6.35,1.27 ; 6.35,-1.27 6.35,1.27 ; 6.35,-1.27 8.89,-1.27 ; 6.35,1.27 8.89,1.27 ; 8.89,-1.27 8.89,1.27 ; 8.89,-1.27 8.89,1.27 ; 8.89,-1.27 11.43,-1.27 ; 8.89,1.27 11.43,1.27 ; 11.43,-1.27 11.43,1.27 ; 11.43,-1.27 11.43,1.27 ; 11.43,-1.27 13.97,-1.27 ; 11.43,1.27 13.97,1.27 ; 13.97,-1.27 13.97,1.27 ; 13.97,-1.27 13.97,1.27 ; 13.97,-1.27 16.51,-1.27 ; 13.97,1.27 16.51,1.27 ; 16.51,-1.27 16.51,1.27 ; 16.51,-1.27 16.51,1.27 ; 16.51,-1.27 19.05,-1.27 ; 16.51,1.27 19.05,1.27 ; 19.05,-1.27 19.05,1.27 ; 19.05,-1.27 19.05,1.27 ; 19.05,-1.27 21.59,-1.27 ; 19.05,1.27 21.59,1.27 ; 21.59,-1.27 21.59,1.27 ; 21.59,-1.27 21.59,1.27 ; 21.59,-1.27 24.13,-1.27 ; 21.59,1.27 24.13,1.27 ; 24.13,-1.27 24.13,1.27 ; 24.13,-1.27 24.13,1.27 ; 24.13,-1.27 26.67,-1.27 ; 24.13,1.27 26.67,1.27 ; 26.67,-1.27 26.67,1.27 ; 26.67,-1.27 26.67,1.27 ; 26.67,-1.27 29.21,-1.27 ; 26.67,1.27 29.21,1.27 ; 29.21,-1.27 29.21,1.27 ; 29.21,-1.27 29.21,1.27 ; 29.21,-1.27 31.75,-1.27 ; 29.21,1.27 31.75,1.27 ; 31.75,-1.27 31.75,1.27 ; 31.75,-1.27 31.75,1.27 ; 31.75,-1.27 34.29,-1.27 ; 31.75,1.27 34.29,1.27 ; 34.29,-1.27 34.29,1.27 ; 34.29,-1.27 36.83,-1.27 ; 34.29,-1.27 34.29,1.27 ; 34.29,1.27 36.83,1.27 ; 36.83,-1.27 36.83,1.27 ; 36.83,-1.27 39.37,-1.27 39.37,1.27 36.83,1.27 ; 36.83,-1.27 36.83,1.27
3D body "User Library-PBS-01.step": height 8.4, standoff -3.2, extent -1.27,-1.27 1.27,1.27
3D body "User Library-PBS-01.step": height 8.4, standoff -3.2, extent 1.27,-1.27 3.81,1.27
3D body "User Library-PBS-01.step": height 8.4, standoff -3.2, extent 3.81,-1.27 6.35,1.27
3D body "User Library-PBS-01.step": height 8.4, standoff -3.2, extent 6.35,-1.27 8.89,1.27
3D body "User Library-PBS-01.step": height 8.4, standoff -3.2, extent 8.89,-1.27 11.43,1.27
3D body "User Library-PBS-01.step": height 8.4, standoff -3.2, extent 11.43,-1.27 13.97,1.27
3D body "User Library-PBS-01.step": height 8.4, standoff -3.2, extent 13.97,-1.27 16.51,1.27
3D body "User Library-PBS-01.step": height 8.4, standoff -3.2, extent 16.51,-1.27 19.05,1.27
3D body "User Library-PBS-01.step": height 8.4, standoff -3.2, extent 19.05,-1.27 21.59,1.27
3D body "User Library-PBS-01.step": height 8.4, standoff -3.2, extent 21.59,-1.27 24.13,1.27
3D body "User Library-PBS-01.step": height 8.4, standoff -3.2, extent 24.13,-1.27 26.67,1.27
3D body "User Library-PBS-01.step": height 8.4, standoff -3.2, extent 26.67,-1.27 29.21,1.27
3D body "User Library-PBS-01.step": height 8.4, standoff -3.2, extent 29.21,-1.27 31.75,1.27
3D body "User Library-PBS-01.step": height 8.4, standoff -3.2, extent 31.75,-1.27 34.29,1.27
3D body "User Library-PBS-01.step": height 8.4, standoff -3.2, extent 34.29,-1.27 36.83,1.27
3D body "User Library-PBS-01.step": height 8.4, standoff -3.2, extent 36.83,-1.27 39.37,1.27